# Altium schematic symbol library jlcpcb_2025_04_resistors_extended_2512.schlib: 2667 symbols (part 8 of 14) (continued)
## FRP2512J470 TS (continued)
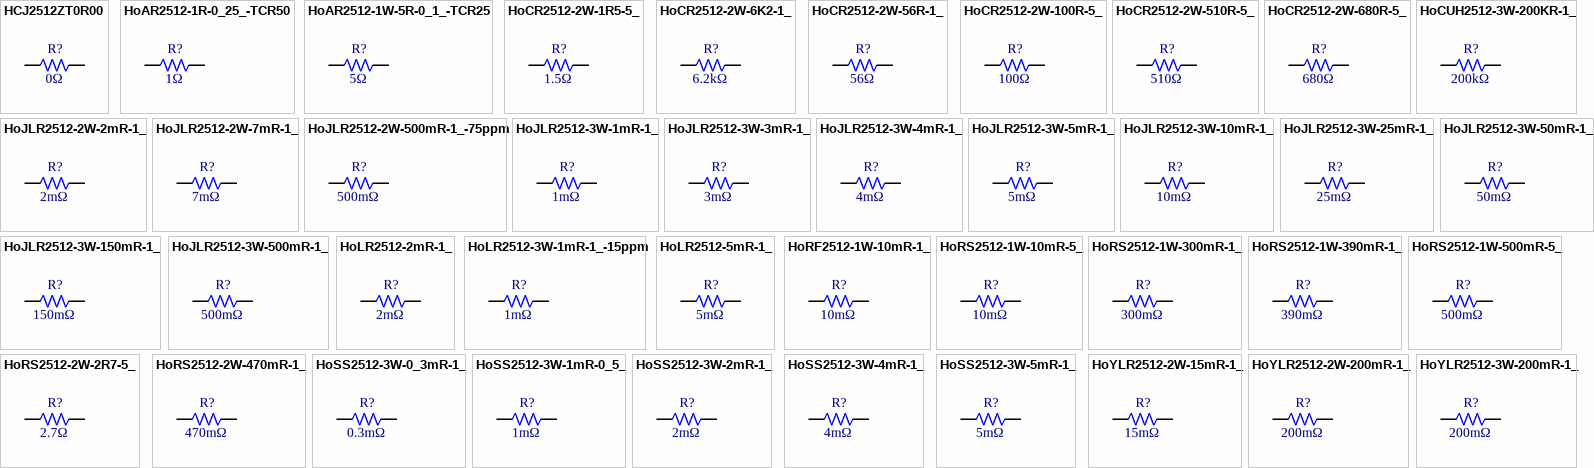
[diagram p37: symbols HCJ2512ZT0R00 to HoYLR2512-3W-200mR-1_]

## HCJ2512ZT0R00
designator R?  Resistance: 0Ω  (hidden comment: *)
Resistor, 0Ω, 2W, -55℃~+155℃, SMD 2512; Manufacturer: Uniroyal; Manufacturer Part Number: HCJ2512ZT0R00; Supplier 1: LCSC; Supplier Part Number 1: C346503; JLCPCB Part Number: C346503; Power Rating: 2W; Category: Resistors; Package Size: 2512; JLCPCB Basic Part: Yes; Temperature Rating: -55℃~+155℃; ComponentLink1Description: Datasheet; ComponentLink1URL: https://wmsc.lcsc.com/wmsc/upload/file/pdf/v2/lcsc/2304140030_SEI-Stackpole-Elec-HCJ2512ZT0R00_C346503.pdf; ComponentLink2Description: JLCPCB Part URL; ComponentLink2URL: https://jlcpcb.com/partdetail/C346503
pins: 1, 2
1 alternate drawing of the same symbol

## HoAR2512-1R-0_25_-TCR50
designator R?  Resistance: 1Ω  (hidden comment: *)
Resistor, 1Ω, ±0.25%, ±50ppm/℃, -55℃~+155℃, SMD 2512; Manufacturer: Uniroyal; Manufacturer Part Number: HoAR2512-1R-0.25%-TCR50; Supplier 1: LCSC; Supplier Part Number 1: C2912612; JLCPCB Part Number: C2912612; Category: Resistors; Package Size: 2512; JLCPCB Basic Part: Yes; Tolerance: ±0.25%; Temperature Coefficient: ±50ppm/℃; Temperature Rating: -55℃~+155℃; ComponentLink1Description: Datasheet; ComponentLink1URL: https://wmsc.lcsc.com/wmsc/upload/file/pdf/v2/lcsc/2111091630_Milliohm-HoAR2512-1R-0-25--TCR50_C2912612.pdf; ComponentLink2Description: JLCPCB Part URL; ComponentLink2URL: https://jlcpcb.com/partdetail/C2912612
pins: 1, 2
1 alternate drawing of the same symbol

## HoAR2512-1W-5R-0_1_-TCR25
designator R?  Resistance: 5Ω  (hidden comment: *)
Resistor, 5Ω, ±0.1%, 1W, ±25ppm/℃, SMD 2512; Manufacturer: Uniroyal; Manufacturer Part Number: HoAR2512-1W-5R-0.1%-TCR25; Supplier 1: LCSC; Supplier Part Number 1: C5123609; JLCPCB Part Number: C5123609; Power Rating: 1W; Category: Resistors; Package Size: 2512; JLCPCB Basic Part: Yes; Tolerance: ±0.1%; Temperature Coefficient: ±25ppm/℃; ComponentLink1Description: Datasheet; ComponentLink1URL: https://wmsc.lcsc.com/wmsc/upload/file/pdf/v2/lcsc/2208051800_Milliohm-HoAR2512-1W-5R-0-1--TCR25_C5123609.pdf; ComponentLink2Description: JLCPCB Part URL; ComponentLink2URL: https://jlcpcb.com/partdetail/C5123609
pins: 1, 2
1 alternate drawing of the same symbol

## HoCR2512-2W-1R5-5_
designator R?  Resistance: 1.5Ω  (hidden comment: *)
Resistor, 1.5Ω, ±5%, 2W, 250V, ±200ppm/℃, -55℃~+155℃, SMD 2512; Manufacturer: Uniroyal; Manufacturer Part Number: HoCR2512-2W-1R5-5%; Supplier 1: LCSC; Supplier Part Number 1: C2912627; JLCPCB Part Number: C2912627; Power Rating: 2W; Category: Resistors; Package Size: 2512; JLCPCB Basic Part: Yes; Tolerance: ±5%; Voltage Rating: 250V; Temperature Coefficient: ±200ppm/℃; Temperature Rating: -55℃~+155℃; ComponentLink1Description: Datasheet; ComponentLink1URL: https://wmsc.lcsc.com/wmsc/upload/file/pdf/v2/lcsc/2111251230_Milliohm-HoCR2512-2W-1R5-5-_C2912627.pdf; ComponentLink2Description: JLCPCB Part URL; ComponentLink2URL: https://jlcpcb.com/partdetail/C2912627
pins: 1, 2
1 alternate drawing of the same symbol

## HoCR2512-2W-6K2-1_
designator R?  Resistance: 6.2kΩ  (hidden comment: *)
Resistor, 6.2kΩ, ±1%, 2W, 250V, ±100ppm/℃, -55℃~+155℃, SMD 2512; Manufacturer: Uniroyal; Manufacturer Part Number: HoCR2512-2W-6K2-1%; Supplier 1: LCSC; Supplier Part Number 1: C2912631; JLCPCB Part Number: C2912631; Power Rating: 2W; Category: Resistors; Package Size: 2512; JLCPCB Basic Part: Yes; Tolerance: ±1%; Voltage Rating: 250V; Temperature Coefficient: ±100ppm/℃; Temperature Rating: -55℃~+155℃; ComponentLink1Description: Datasheet; ComponentLink1URL: https://wmsc.lcsc.com/wmsc/upload/file/pdf/v2/lcsc/2111251230_Milliohm-HoCR2512-2W-6K2-1-_C2912631.pdf; ComponentLink2Description: JLCPCB Part URL; ComponentLink2URL: https://jlcpcb.com/partdetail/C2912631
pins: 1, 2
1 alternate drawing of the same symbol

## HoCR2512-2W-56R-1_
designator R?  Resistance: 56Ω  (hidden comment: *)
Resistor, 56Ω, ±1%, 2W, 250V, ±100ppm/℃, -55℃~+155℃, SMD 2512; Manufacturer: Uniroyal; Manufacturer Part Number: HoCR2512-2W-56R-1%; Supplier 1: LCSC; Supplier Part Number 1: C2912630; JLCPCB Part Number: C2912630; Power Rating: 2W; Category: Resistors; Package Size: 2512; JLCPCB Basic Part: Yes; Tolerance: ±1%; Voltage Rating: 250V; Temperature Coefficient: ±100ppm/℃; Temperature Rating: -55℃~+155℃; ComponentLink1Description: Datasheet; ComponentLink1URL: https://wmsc.lcsc.com/wmsc/upload/file/pdf/v2/lcsc/2111251230_Milliohm-HoCR2512-2W-56R-1-_C2912630.pdf; ComponentLink2Description: JLCPCB Part URL; ComponentLink2URL: https://jlcpcb.com/partdetail/C2912630
pins: 1, 2
1 alternate drawing of the same symbol

## HoCR2512-2W-100R-5_
designator R?  Resistance: 100Ω  (hidden comment: *)
Resistor, 100Ω, ±5%, 2W, 250V, ±100ppm/℃, -55℃~+155℃, SMD 2512; Manufacturer: Uniroyal; Manufacturer Part Number: HoCR2512-2W-100R-5%; Supplier 1: LCSC; Supplier Part Number 1: C2904495; JLCPCB Part Number: C2904495; Power Rating: 2W; Category: Resistors; Package Size: 2512; JLCPCB Basic Part: Yes; Tolerance: ±5%; Voltage Rating: 250V; Temperature Coefficient: ±100ppm/℃; Temperature Rating: -55℃~+155℃; ComponentLink1Description: Datasheet; ComponentLink1URL: https://wmsc.lcsc.com/wmsc/upload/file/pdf/v2/lcsc/2111101730_Milliohm-HoCR2512-2W-100R-5-_C2904495.pdf; ComponentLink2Description: JLCPCB Part URL; ComponentLink2URL: https://jlcpcb.com/partdetail/C2904495
pins: 1, 2
1 alternate drawing of the same symbol

## HoCR2512-2W-510R-5_
designator R?  Resistance: 510Ω  (hidden comment: *)
Resistor, 510Ω, ±5%, 2W, 250V, ±100ppm/℃, -55℃~+155℃, SMD 2512; Manufacturer: Uniroyal; Manufacturer Part Number: HoCR2512-2W-510R-5%; Supplier 1: LCSC; Supplier Part Number 1: C2912629; JLCPCB Part Number: C2912629; Power Rating: 2W; Category: Resistors; Package Size: 2512; JLCPCB Basic Part: Yes; Tolerance: ±5%; Voltage Rating: 250V; Temperature Coefficient: ±100ppm/℃; Temperature Rating: -55℃~+155℃; ComponentLink1Description: Datasheet; ComponentLink1URL: https://wmsc.lcsc.com/wmsc/upload/file/pdf/v2/lcsc/2111251230_Milliohm-HoCR2512-2W-510R-5-_C2912629.pdf; ComponentLink2Description: JLCPCB Part URL; ComponentLink2URL: https://jlcpcb.com/partdetail/C2912629
pins: 1, 2
1 alternate drawing of the same symbol

## HoCR2512-2W-680R-5_
designator R?  Resistance: 680Ω  (hidden comment: *)
Resistor, 680Ω, ±5%, 2W, SMD 2512; Manufacturer: Uniroyal; Manufacturer Part Number: HoCR2512-2W-680R-5%; Supplier 1: LCSC; Supplier Part Number 1: C5123633; JLCPCB Part Number: C5123633; Power Rating: 2W; Category: Resistors; Package Size: 2512; JLCPCB Basic Part: Yes; Tolerance: ±5%; ComponentLink1Description: Datasheet; ComponentLink1URL: https://wmsc.lcsc.com/wmsc/upload/file/pdf/v2/lcsc/2208151830_Milliohm-HoCR2512-2W-680R-5-_C5123633.pdf; ComponentLink2Description: JLCPCB Part URL; ComponentLink2URL: https://jlcpcb.com/partdetail/C5123633
pins: 1, 2
1 alternate drawing of the same symbol

## HoCUH2512-3W-200KR-1_
designator R?  Resistance: 200kΩ  (hidden comment: *)
Resistor, 200kΩ, ±1%, 3W, SMD 2512; Manufacturer: Uniroyal; Manufacturer Part Number: HoCUH2512-3W-200KR-1%; Supplier 1: LCSC; Supplier Part Number 1: C5123645; JLCPCB Part Number: C5123645; Power Rating: 3W; Category: Resistors; Package Size: 2512; JLCPCB Basic Part: Yes; Tolerance: ±1%; ComponentLink1Description: Datasheet; ComponentLink1URL: https://wmsc.lcsc.com/wmsc/upload/file/pdf/v2/lcsc/2208171800_Milliohm-HoCUH2512-3W-200KR-1-_C5123645.pdf; ComponentLink2Description: JLCPCB Part URL; ComponentLink2URL: https://jlcpcb.com/partdetail/C5123645
pins: 1, 2
1 alternate drawing of the same symbol

## HoJLR2512-2W-2mR-1_
designator R?  Resistance: 2mΩ  (hidden comment: *)
Resistor, 2mΩ, 2W, SMD 2512; Manufacturer: Uniroyal; Manufacturer Part Number: HoJLR2512-2W-2mR-1%; Supplier 1: LCSC; Supplier Part Number 1: C2904228; JLCPCB Part Number: C2904228; Power Rating: 2W; Category: Resistors; Package Size: 2512; JLCPCB Basic Part: Yes; ComponentLink1Description: Datasheet; ComponentLink1URL: https://wmsc.lcsc.com/wmsc/upload/file/pdf/v2/lcsc/2110272030_Milliohm-HoJLR2512-2W-2mR-1-_C2904228.pdf; ComponentLink2Description: JLCPCB Part URL; ComponentLink2URL: https://jlcpcb.com/partdetail/C2904228
pins: 1, 2
1 alternate drawing of the same symbol

## HoJLR2512-2W-7mR-1_
designator R?  Resistance: 7mΩ  (hidden comment: *)
Resistor, 7mΩ, 2W, SMD 2512; Manufacturer: Uniroyal; Manufacturer Part Number: HoJLR2512-2W-7mR-1%; Supplier 1: LCSC; Supplier Part Number 1: C2904232; JLCPCB Part Number: C2904232; Power Rating: 2W; Category: Resistors; Package Size: 2512; JLCPCB Basic Part: Yes; ComponentLink1Description: Datasheet; ComponentLink2Description: JLCPCB Part URL; ComponentLink2URL: https://jlcpcb.com/partdetail/C2904232
pins: 1, 2
1 alternate drawing of the same symbol

## HoJLR2512-2W-500mR-1_-75ppm
designator R?  Resistance: 500mΩ  (hidden comment: *)
Resistor, 500mΩ, 2W, SMD 2512; Manufacturer: Uniroyal; Manufacturer Part Number: HoJLR2512-2W-500mR-1%-75ppm; Supplier 1: LCSC; Supplier Part Number 1: C2924583; JLCPCB Part Number: C2924583; Power Rating: 2W; Category: Resistors; Package Size: 2512; JLCPCB Basic Part: Yes; ComponentLink1Description: Datasheet; ComponentLink1URL: https://wmsc.lcsc.com/wmsc/upload/file/pdf/v2/lcsc/2201121300_Milliohm-HoJLR2512-2W-500mR-1--75ppm_C2924583.pdf; ComponentLink2Description: JLCPCB Part URL; ComponentLink2URL: https://jlcpcb.com/partdetail/C2924583
pins: 1, 2
1 alternate drawing of the same symbol

## HoJLR2512-3W-1mR-1_
designator R?  Resistance: 1mΩ  (hidden comment: *)
Resistor, 1mΩ, 3W, SMD 2512; Manufacturer: Uniroyal; Manufacturer Part Number: HoJLR2512-3W-1mR-1%; Supplier 1: LCSC; Supplier Part Number 1: C2903470; JLCPCB Part Number: C2903470; Power Rating: 3W; Category: Resistors; Package Size: 2512; JLCPCB Basic Part: Yes; ComponentLink1Description: Datasheet; ComponentLink1URL: https://wmsc.lcsc.com/wmsc/upload/file/pdf/v2/lcsc/2110101130_Milliohm-HoJLR2512-3W-1mR-1-_C2903470.pdf; ComponentLink2Description: JLCPCB Part URL; ComponentLink2URL: https://jlcpcb.com/partdetail/C2903470
pins: 1, 2
1 alternate drawing of the same symbol

## HoJLR2512-3W-3mR-1_
designator R?  Resistance: 3mΩ  (hidden comment: *)
Resistor, 3mΩ, 3W, SMD 2512; Manufacturer: Uniroyal; Manufacturer Part Number: HoJLR2512-3W-3mR-1%; Supplier 1: LCSC; Supplier Part Number 1: C2903488; JLCPCB Part Number: C2903488; Power Rating: 3W; Category: Resistors; Package Size: 2512; JLCPCB Basic Part: Yes; ComponentLink1Description: Datasheet; ComponentLink1URL: https://wmsc.lcsc.com/wmsc/upload/file/pdf/v2/lcsc/2110101130_Milliohm-HoJLR2512-3W-3mR-1-_C2903488.pdf; ComponentLink2Description: JLCPCB Part URL; ComponentLink2URL: https://jlcpcb.com/partdetail/C2903488
pins: 1, 2
1 alternate drawing of the same symbol

## HoJLR2512-3W-4mR-1_
designator R?  Resistance: 4mΩ  (hidden comment: *)
Resistor, 4mΩ, 3W, SMD 2512; Manufacturer: Uniroyal; Manufacturer Part Number: HoJLR2512-3W-4mR-1%; Supplier 1: LCSC; Supplier Part Number 1: C2904236; JLCPCB Part Number: C2904236; Power Rating: 3W; Category: Resistors; Package Size: 2512; JLCPCB Basic Part: Yes; ComponentLink1Description: Datasheet; ComponentLink1URL: https://wmsc.lcsc.com/wmsc/upload/file/pdf/v2/lcsc/2110272030_Milliohm-HoJLR2512-3W-4mR-1-_C2904236.pdf; ComponentLink2Description: JLCPCB Part URL; ComponentLink2URL: https://jlcpcb.com/partdetail/C2904236
pins: 1, 2
1 alternate drawing of the same symbol

## HoJLR2512-3W-5mR-1_
designator R?  Resistance: 5mΩ  (hidden comment: *)
Resistor, 5mΩ, 3W, SMD 2512; Manufacturer: Uniroyal; Manufacturer Part Number: HoJLR2512-3W-5mR-1%; Supplier 1: LCSC; Supplier Part Number 1: C2903482; JLCPCB Part Number: C2903482; Power Rating: 3W; Category: Resistors; Package Size: 2512; JLCPCB Basic Part: Yes; ComponentLink1Description: Datasheet; ComponentLink1URL: https://wmsc.lcsc.com/wmsc/upload/file/pdf/v2/lcsc/2110101130_Milliohm-HoJLR2512-3W-5mR-1-_C2903482.pdf; ComponentLink2Description: JLCPCB Part URL; ComponentLink2URL: https://jlcpcb.com/partdetail/C2903482
pins: 1, 2
1 alternate drawing of the same symbol

## HoJLR2512-3W-10mR-1_
designator R?  Resistance: 10mΩ  (hidden comment: *)
Resistor, 10mΩ, 3W, SMD 2512; Manufacturer: Uniroyal; Manufacturer Part Number: HoJLR2512-3W-10mR-1%; Supplier 1: LCSC; Supplier Part Number 1: C2903468; JLCPCB Part Number: C2903468; Power Rating: 3W; Category: Resistors; Package Size: 2512; JLCPCB Basic Part: Yes; ComponentLink1Description: Datasheet; ComponentLink1URL: https://wmsc.lcsc.com/wmsc/upload/file/pdf/v2/lcsc/2110101130_Milliohm-HoJLR2512-3W-10mR-1-_C2903468.pdf; ComponentLink2Description: JLCPCB Part URL; ComponentLink2URL: https://jlcpcb.com/partdetail/C2903468
pins: 1, 2
1 alternate drawing of the same symbol

## HoJLR2512-3W-25mR-1_
designator R?  Resistance: 25mΩ  (hidden comment: *)
Resistor, 25mΩ, 3W, SMD 2512; Manufacturer: Uniroyal; Manufacturer Part Number: HoJLR2512-3W-25mR-1%; Supplier 1: LCSC; Supplier Part Number 1: C2903480; JLCPCB Part Number: C2903480; Power Rating: 3W; Category: Resistors; Package Size: 2512; JLCPCB Basic Part: Yes; ComponentLink1Description: Datasheet; ComponentLink1URL: https://wmsc.lcsc.com/wmsc/upload/file/pdf/v2/lcsc/2110101130_Milliohm-HoJLR2512-3W-25mR-1-_C2903480.pdf; ComponentLink2Description: JLCPCB Part URL; ComponentLink2URL: https://jlcpcb.com/partdetail/C2903480
pins: 1, 2
1 alternate drawing of the same symbol

## HoJLR2512-3W-50mR-1_
designator R?  Resistance: 50mΩ  (hidden comment: *)
Resistor, 50mΩ, 3W, SMD 2512; Manufacturer: Uniroyal; Manufacturer Part Number: HoJLR2512-3W-50mR-1%; Supplier 1: LCSC; Supplier Part Number 1: C2903475; JLCPCB Part Number: C2903475; Power Rating: 3W; Category: Resistors; Package Size: 2512; JLCPCB Basic Part: Yes; ComponentLink1Description: Datasheet; ComponentLink1URL: https://wmsc.lcsc.com/wmsc/upload/file/pdf/v2/lcsc/2110101130_Milliohm-HoJLR2512-3W-50mR-1-_C2903475.pdf; ComponentLink2Description: JLCPCB Part URL; ComponentLink2URL: https://jlcpcb.com/partdetail/C2903475
pins: 1, 2
1 alternate drawing of the same symbol

## HoJLR2512-3W-150mR-1_
designator R?  Resistance: 150mΩ  (hidden comment: *)
Resistor, 150mΩ, 3W, SMD 2512; Manufacturer: Uniroyal; Manufacturer Part Number: HoJLR2512-3W-150mR-1%; Supplier 1: LCSC; Supplier Part Number 1: C2903485; JLCPCB Part Number: C2903485; Power Rating: 3W; Category: Resistors; Package Size: 2512; JLCPCB Basic Part: Yes; ComponentLink1Description: Datasheet; ComponentLink1URL: https://wmsc.lcsc.com/wmsc/upload/file/pdf/v2/lcsc/2110101130_Milliohm-HoJLR2512-3W-150mR-1-_C2903485.pdf; ComponentLink2Description: JLCPCB Part URL; ComponentLink2URL: https://jlcpcb.com/partdetail/C2903485
pins: 1, 2
1 alternate drawing of the same symbol

## HoJLR2512-3W-500mR-1_
designator R?  Resistance: 500mΩ  (hidden comment: *)
Resistor, 500mΩ, 3W, SMD 2512; Manufacturer: Uniroyal; Manufacturer Part Number: HoJLR2512-3W-500mR-1%; Supplier 1: LCSC; Supplier Part Number 1: C2904268; JLCPCB Part Number: C2904268; Power Rating: 3W; Category: Resistors; Package Size: 2512; JLCPCB Basic Part: Yes; ComponentLink1Description: Datasheet; ComponentLink1URL: https://wmsc.lcsc.com/wmsc/upload/file/pdf/v2/lcsc/2110272030_Milliohm-HoJLR2512-3W-500mR-1-_C2904268.pdf; ComponentLink2Description: JLCPCB Part URL; ComponentLink2URL: https://jlcpcb.com/partdetail/C2904268
pins: 1, 2
1 alternate drawing of the same symbol

## HoLR2512-2mR-1_
designator R?  Resistance: 2mΩ  (hidden comment: *)
Resistor, 2mΩ, SMD 2512; Manufacturer: Uniroyal; Manufacturer Part Number: HoLR2512-2mR-1%; Supplier 1: LCSC; Supplier Part Number 1: C2844506; JLCPCB Part Number: C2844506; Category: Resistors; Package Size: 2512; JLCPCB Basic Part: Yes; ComponentLink1Description: Datasheet; ComponentLink1URL: https://wmsc.lcsc.com/wmsc/upload/file/pdf/v2/lcsc/2108072230_Milliohm-HoLR2512-2mR-1-_C2844506.pdf; ComponentLink2Description: JLCPCB Part URL; ComponentLink2URL: https://jlcpcb.com/partdetail/C2844506
pins: 1, 2
1 alternate drawing of the same symbol

## HoLR2512-3W-1mR-1_-15ppm
designator R?  Resistance: 1mΩ  (hidden comment: *)
Resistor, 1mΩ, 3W, SMD 2512; Manufacturer: Uniroyal; Manufacturer Part Number: HoLR2512-3W-1mR-1%-15ppm; Supplier 1: LCSC; Supplier Part Number 1: C2908363; JLCPCB Part Number: C2908363; Power Rating: 3W; Category: Resistors; Package Size: 2512; JLCPCB Basic Part: Yes; ComponentLink1Description: Datasheet; ComponentLink1URL: https://wmsc.lcsc.com/wmsc/upload/file/pdf/v2/lcsc/2111241830_Milliohm-HoLR2512-3W-1mR-1--15ppm_C2908363.pdf; ComponentLink2Description: JLCPCB Part URL; ComponentLink2URL: https://jlcpcb.com/partdetail/C2908363
pins: 1, 2
1 alternate drawing of the same symbol

## HoLR2512-5mR-1_
designator R?  Resistance: 5mΩ  (hidden comment: *)
Resistor, 5mΩ, SMD 2512; Manufacturer: Uniroyal; Manufacturer Part Number: HoLR2512-5mR-1%; Supplier 1: LCSC; Supplier Part Number 1: C2844509; JLCPCB Part Number: C2844509; Category: Resistors; Package Size: 2512; JLCPCB Basic Part: Yes; ComponentLink1Description: Datasheet; ComponentLink1URL: https://wmsc.lcsc.com/wmsc/upload/file/pdf/v2/lcsc/2108072230_Milliohm-HoLR2512-5mR-1-_C2844509.pdf; ComponentLink2Description: JLCPCB Part URL; ComponentLink2URL: https://jlcpcb.com/partdetail/C2844509
pins: 1, 2
1 alternate drawing of the same symbol

## HoRF2512-1W-10mR-1_
designator R?  Resistance: 10mΩ  (hidden comment: *)
Resistor, 10mΩ, ±1%, 1W, SMD 2512; Manufacturer: Uniroyal; Manufacturer Part Number: HoRF2512-1W-10mR-1%; Supplier 1: LCSC; Supplier Part Number 1: C5127865; JLCPCB Part Number: C5127865; Power Rating: 1W; Category: Resistors; Package Size: 2512; JLCPCB Basic Part: Yes; Tolerance: ±1%; ComponentLink1Description: Datasheet; ComponentLink1URL: https://wmsc.lcsc.com/wmsc/upload/file/pdf/v2/lcsc/2208250030_Milliohm-HoRF2512-1W-10mR-1-_C5127865.pdf; ComponentLink2Description: JLCPCB Part URL; ComponentLink2URL: https://jlcpcb.com/partdetail/C5127865
pins: 1, 2
1 alternate drawing of the same symbol

## HoRS2512-1W-10mR-5_
designator R?  Resistance: 10mΩ  (hidden comment: *)
Resistor, 10mΩ, ±5%, 1W, ±1500ppm/℃, -55℃~+155℃, SMD 2512; Manufacturer: Uniroyal; Manufacturer Part Number: HoRS2512-1W-10mR-5%; Supplier 1: LCSC; Supplier Part Number 1: C2912758; JLCPCB Part Number: C2912758; Power Rating: 1W; Category: Resistors; Package Size: 2512; JLCPCB Basic Part: Yes; Tolerance: ±5%; Temperature Coefficient: ±1500ppm/℃; Temperature Rating: -55℃~+155℃; ComponentLink1Description: Datasheet; ComponentLink1URL: https://wmsc.lcsc.com/wmsc/upload/file/pdf/v2/lcsc/2111190930_Milliohm-HoRS2512-1W-10mR-5-_C2912758.pdf; ComponentLink2Description: JLCPCB Part URL; ComponentLink2URL: https://jlcpcb.com/partdetail/C2912758
pins: 1, 2
1 alternate drawing of the same symbol

## HoRS2512-1W-300mR-1_
designator R?  Resistance: 300mΩ  (hidden comment: *)
Resistor, 300mΩ, ±1%, 1W, ±500ppm/℃, -55℃~+155℃, SMD 2512; Manufacturer: Uniroyal; Manufacturer Part Number: HoRS2512-1W-300mR-1%; Supplier 1: LCSC; Supplier Part Number 1: C2904492; JLCPCB Part Number: C2904492; Power Rating: 1W; Category: Resistors; Package Size: 2512; JLCPCB Basic Part: Yes; Tolerance: ±1%; Temperature Coefficient: ±500ppm/℃; Temperature Rating: -55℃~+155℃; ComponentLink1Description: Datasheet; ComponentLink1URL: https://wmsc.lcsc.com/wmsc/upload/file/pdf/v2/lcsc/2111101730_Milliohm-HoRS2512-1W-300mR-1-_C2904492.pdf; ComponentLink2Description: JLCPCB Part URL; ComponentLink2URL: https://jlcpcb.com/partdetail/C2904492
pins: 1, 2
1 alternate drawing of the same symbol

## HoRS2512-1W-390mR-1_
designator R?  Resistance: 390mΩ  (hidden comment: *)
Resistor, 390mΩ, ±1%, 1W, ±500ppm/℃, -55℃~+155℃, SMD 2512; Manufacturer: Uniroyal; Manufacturer Part Number: HoRS2512-1W-390mR-1%; Supplier 1: LCSC; Supplier Part Number 1: C2912764; JLCPCB Part Number: C2912764; Power Rating: 1W; Category: Resistors; Package Size: 2512; JLCPCB Basic Part: Yes; Tolerance: ±1%; Temperature Coefficient: ±500ppm/℃; Temperature Rating: -55℃~+155℃; ComponentLink1Description: Datasheet; ComponentLink1URL: https://wmsc.lcsc.com/wmsc/upload/file/pdf/v2/lcsc/2111190930_Milliohm-HoRS2512-1W-390mR-1-_C2912764.pdf; ComponentLink2Description: JLCPCB Part URL; ComponentLink2URL: https://jlcpcb.com/partdetail/C2912764
pins: 1, 2
1 alternate drawing of the same symbol

## HoRS2512-1W-500mR-5_
designator R?  Resistance: 500mΩ  (hidden comment: *)
Resistor, 500mΩ, ±5%, 1W, ±500ppm/℃, -55℃~+155℃, SMD 2512; Manufacturer: Uniroyal; Manufacturer Part Number: HoRS2512-1W-500mR-5%; Supplier 1: LCSC; Supplier Part Number 1: C2912767; JLCPCB Part Number: C2912767; Power Rating: 1W; Category: Resistors; Package Size: 2512; JLCPCB Basic Part: Yes; Tolerance: ±5%; Temperature Coefficient: ±500ppm/℃; Temperature Rating: -55℃~+155℃; ComponentLink1Description: Datasheet; ComponentLink1URL: https://wmsc.lcsc.com/wmsc/upload/file/pdf/v2/lcsc/2111190930_Milliohm-HoRS2512-1W-500mR-5-_C2912767.pdf; ComponentLink2Description: JLCPCB Part URL; ComponentLink2URL: https://jlcpcb.com/partdetail/C2912767
pins: 1, 2
1 alternate drawing of the same symbol

## HoRS2512-2W-2R7-5_
designator R?  Resistance: 2.7Ω  (hidden comment: *)
Resistor, 2.7Ω, ±5%, 2W, -55℃~+155℃, SMD 2512; Manufacturer: Uniroyal; Manufacturer Part Number: HoRS2512-2W-2R7-5%; Supplier 1: LCSC; Supplier Part Number 1: C2912771; JLCPCB Part Number: C2912771; Power Rating: 2W; Category: Resistors; Package Size: 2512; JLCPCB Basic Part: Yes; Tolerance: ±5%; Temperature Rating: -55℃~+155℃; ComponentLink1Description: Datasheet; ComponentLink2Description: JLCPCB Part URL; ComponentLink2URL: https://jlcpcb.com/partdetail/C2912771
pins: 1, 2
1 alternate drawing of the same symbol

## HoRS2512-2W-470mR-1_
designator R?  Resistance: 470mΩ  (hidden comment: *)
Resistor, 470mΩ, ±1%, 2W, ±500ppm/℃, -55℃~+155℃, SMD 2512; Manufacturer: Uniroyal; Manufacturer Part Number: HoRS2512-2W-470mR-1%; Supplier 1: LCSC; Supplier Part Number 1: C2912772; JLCPCB Part Number: C2912772; Power Rating: 2W; Category: Resistors; Package Size: 2512; JLCPCB Basic Part: Yes; Tolerance: ±1%; Temperature Coefficient: ±500ppm/℃; Temperature Rating: -55℃~+155℃; ComponentLink1Description: Datasheet; ComponentLink1URL: https://wmsc.lcsc.com/wmsc/upload/file/pdf/v2/lcsc/2111191930_Milliohm-HoRS2512-2W-470mR-1-_C2912772.pdf; ComponentLink2Description: JLCPCB Part URL; ComponentLink2URL: https://jlcpcb.com/partdetail/C2912772
pins: 1, 2
1 alternate drawing of the same symbol

## HoSS2512-3W-0_3mR-1_
designator R?  Resistance: 0.3mΩ  (hidden comment: *)
Resistor, 0.3mΩ, ±1%, 3W, SMD 2512; Manufacturer: Uniroyal; Manufacturer Part Number: HoSS2512-3W-0.3mR-1%; Supplier 1: LCSC; Supplier Part Number 1: C5336180; JLCPCB Part Number: C5336180; Power Rating: 3W; Category: Resistors; Package Size: 2512; JLCPCB Basic Part: Yes; Tolerance: ±1%; ComponentLink1Description: Datasheet; ComponentLink1URL: https://wmsc.lcsc.com/wmsc/upload/file/pdf/v2/lcsc/2212291709_Milliohm-HoSS2512-3W-0-3mR-1-_C5336180.pdf; ComponentLink2Description: JLCPCB Part URL; ComponentLink2URL: https://jlcpcb.com/partdetail/C5336180
pins: 1, 2
1 alternate drawing of the same symbol

## HoSS2512-3W-1mR-0_5_
designator R?  Resistance: 1mΩ  (hidden comment: *)
Resistor, 1mΩ, 3W, SMD 2512; Manufacturer: Uniroyal; Manufacturer Part Number: HoSS2512-3W-1mR-0.5%; Supplier 1: LCSC; Supplier Part Number 1: C5336183; JLCPCB Part Number: C5336183; Power Rating: 3W; Category: Resistors; Package Size: 2512; JLCPCB Basic Part: Yes; ComponentLink1Description: Datasheet; ComponentLink1URL: https://wmsc.lcsc.com/wmsc/upload/file/pdf/v2/lcsc/2212291709_Milliohm-HoSS2512-3W-1mR-0-5-_C5336183.pdf; ComponentLink2Description: JLCPCB Part URL; ComponentLink2URL: https://jlcpcb.com/partdetail/C5336183
pins: 1, 2
1 alternate drawing of the same symbol

## HoSS2512-3W-2mR-1_
designator R?  Resistance: 2mΩ  (hidden comment: *)
Resistor, 2mΩ, ±1%, 3W, SMD 2512; Manufacturer: Uniroyal; Manufacturer Part Number: HoSS2512-3W-2mR-1%; Supplier 1: LCSC; Supplier Part Number 1: C5336185; JLCPCB Part Number: C5336185; Power Rating: 3W; Category: Resistors; Package Size: 2512; JLCPCB Basic Part: Yes; Tolerance: ±1%; ComponentLink1Description: Datasheet; ComponentLink1URL: https://wmsc.lcsc.com/wmsc/upload/file/pdf/v2/lcsc/2212291709_Milliohm-HoSS2512-3W-2mR-1-_C5336185.pdf; ComponentLink2Description: JLCPCB Part URL; ComponentLink2URL: https://jlcpcb.com/partdetail/C5336185
pins: 1, 2
1 alternate drawing of the same symbol

## HoSS2512-3W-4mR-1_
designator R?  Resistance: 4mΩ  (hidden comment: *)
Resistor, 4mΩ, ±1%, 3W, SMD 2512; Manufacturer: Uniroyal; Manufacturer Part Number: HoSS2512-3W-4mR-1%; Supplier 1: LCSC; Supplier Part Number 1: C5336187; JLCPCB Part Number: C5336187; Power Rating: 3W; Category: Resistors; Package Size: 2512; JLCPCB Basic Part: Yes; Tolerance: ±1%; ComponentLink1Description: Datasheet; ComponentLink1URL: https://wmsc.lcsc.com/wmsc/upload/file/pdf/v2/lcsc/2212291709_Milliohm-HoSS2512-3W-4mR-1-_C5336187.pdf; ComponentLink2Description: JLCPCB Part URL; ComponentLink2URL: https://jlcpcb.com/partdetail/C5336187
pins: 1, 2
1 alternate drawing of the same symbol

## HoSS2512-3W-5mR-1_
designator R?  Resistance: 5mΩ  (hidden comment: *)
Resistor, 5mΩ, ±1%, 3W, SMD 2512; Manufacturer: Uniroyal; Manufacturer Part Number: HoSS2512-3W-5mR-1%; Supplier 1: LCSC; Supplier Part Number 1: C5336188; JLCPCB Part Number: C5336188; Power Rating: 3W; Category: Resistors; Package Size: 2512; JLCPCB Basic Part: Yes; Tolerance: ±1%; ComponentLink1Description: Datasheet; ComponentLink1URL: https://wmsc.lcsc.com/wmsc/upload/file/pdf/v2/lcsc/2212291709_Milliohm-HoSS2512-3W-5mR-1-_C5336188.pdf; ComponentLink2Description: JLCPCB Part URL; ComponentLink2URL: https://jlcpcb.com/partdetail/C5336188
pins: 1, 2
1 alternate drawing of the same symbol

## HoYLR2512-2W-15mR-1_
designator R?  Resistance: 15mΩ  (hidden comment: *)
Resistor, 15mΩ, ±1%, 2W, SMD 2512; Manufacturer: Uniroyal; Manufacturer Part Number: HoYLR2512-2W-15mR-1%; Supplier 1: LCSC; Supplier Part Number 1: C5375422; JLCPCB Part Number: C5375422; Power Rating: 2W; Category: Resistors; Package Size: 2512; JLCPCB Basic Part: Yes; Tolerance: ±1%; ComponentLink1Description: Datasheet; ComponentLink2Description: JLCPCB Part URL; ComponentLink2URL: https://jlcpcb.com/partdetail/C5375422
pins: 1, 2
1 alternate drawing of the same symbol

## HoYLR2512-2W-200mR-1_
designator R?  Resistance: 200mΩ  (hidden comment: *)
Resistor, 200mΩ, ±1%, 2W, SMD 2512; Manufacturer: Uniroyal; Manufacturer Part Number: HoYLR2512-2W-200mR-1%; Supplier 1: LCSC; Supplier Part Number 1: C5375444; JLCPCB Part Number: C5375444; Power Rating: 2W; Category: Resistors; Package Size: 2512; JLCPCB Basic Part: Yes; Tolerance: ±1%; ComponentLink1Description: Datasheet; ComponentLink2Description: JLCPCB Part URL; ComponentLink2URL: https://jlcpcb.com/partdetail/C5375444
pins: 1, 2
1 alternate drawing of the same symbol

## HoYLR2512-3W-200mR-1_
designator R?  Resistance: 200mΩ  (hidden comment: *)
Resistor, 200mΩ, ±1%, 3W, SMD 2512; Manufacturer: Uniroyal; Manufacturer Part Number: HoYLR2512-3W-200mR-1%; Supplier 1: LCSC; Supplier Part Number 1: C5375488; JLCPCB Part Number: C5375488; Power Rating: 3W; Category: Resistors; Package Size: 2512; JLCPCB Basic Part: Yes; Tolerance: ±1%; ComponentLink1Description: Datasheet; ComponentLink2Description: JLCPCB Part URL; ComponentLink2URL: https://jlcpcb.com/partdetail/C5375488
pins: 1, 2
1 alternate drawing of the same symbol

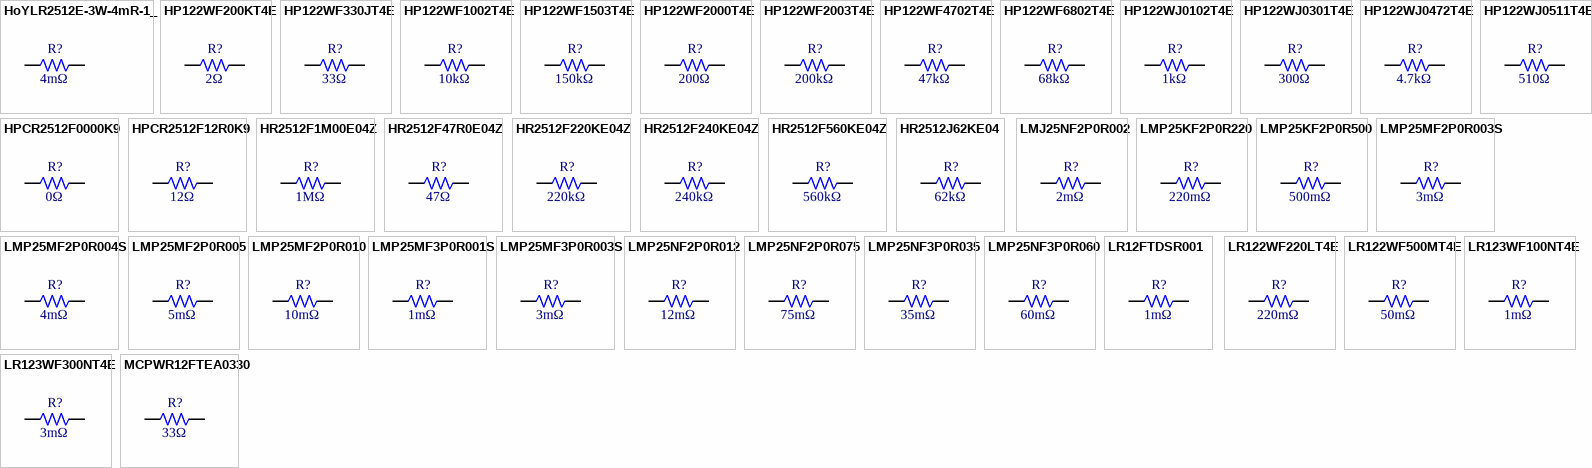
[diagram p38: symbols HoYLR2512E-3W-4mR-1_ to MCPWR12FTEA0330]

## HoYLR2512E-3W-4mR-1_
designator R?  Resistance: 4mΩ  (hidden comment: *)
Resistor, 4mΩ, ±1%, 3W, SMD 2512; Manufacturer: Uniroyal; Manufacturer Part Number: HoYLR2512E-3W-4mR-1%; Supplier 1: LCSC; Supplier Part Number 1: C5375455; JLCPCB Part Number: C5375455; Power Rating: 3W; Category: Resistors; Package Size: 2512; JLCPCB Basic Part: Yes; Tolerance: ±1%; ComponentLink1Description: Datasheet; ComponentLink1URL: https://wmsc.lcsc.com/wmsc/upload/file/pdf/v2/lcsc/2306061457_Milliohm-HoYLR2512E-3W-4mR-1-_C5375455.pdf; ComponentLink2Description: JLCPCB Part URL; ComponentLink2URL: https://jlcpcb.com/partdetail/C5375455
pins: 1, 2
1 alternate drawing of the same symbol

## HP122WF200KT4E
designator R?  Resistance: 2Ω  (hidden comment: *)
Resistor, 2Ω, ±1%, 2W, 200V, ±75ppm/℃, -55℃~+155℃, SMD 2512; Manufacturer: Uniroyal; Manufacturer Part Number: HP122WF200KT4E; Supplier 1: LCSC; Supplier Part Number 1: C91926; JLCPCB Part Number: C91926; Power Rating: 2W; Category: Resistors; Package Size: 2512; JLCPCB Basic Part: Yes; Tolerance: ±1%; Voltage Rating: 200V; Temperature Coefficient: ±75ppm/℃; Temperature Rating: -55℃~+155℃; ComponentLink1Description: Datasheet; ComponentLink1URL: https://wmsc.lcsc.com/wmsc/upload/file/pdf/v2/lcsc/1810301110_UNI-ROYAL-Uniroyal-Elec-HP122WF200KT4E_C91926.pdf; ComponentLink2Description: JLCPCB Part URL; ComponentLink2URL: https://jlcpcb.com/partdetail/C91926
pins: 1, 2
1 alternate drawing of the same symbol

## HP122WF330JT4E
designator R?  Resistance: 33Ω  (hidden comment: *)
Resistor, 33Ω, ±1%, 2W, 300V, -55℃~+155℃, SMD 2512; Manufacturer: Uniroyal; Manufacturer Part Number: HP122WF330JT4E; Supplier 1: LCSC; Supplier Part Number 1: C2758887; JLCPCB Part Number: C2758887; Power Rating: 2W; Category: Resistors; Package Size: 2512; JLCPCB Basic Part: Yes; Tolerance: ±1%; Voltage Rating: 300V; Temperature Rating: -55℃~+155℃; ComponentLink1Description: Datasheet; ComponentLink2Description: JLCPCB Part URL; ComponentLink2URL: https://jlcpcb.com/partdetail/C2758887
pins: 1, 2
1 alternate drawing of the same symbol

## HP122WF1002T4E
designator R?  Resistance: 10kΩ  (hidden comment: *)
Resistor, 10kΩ, ±1%, 2W, 300V, ±75ppm/℃, -55℃~+155℃, SMD 2512; Manufacturer: Uniroyal; Manufacturer Part Number: HP122WF1002T4E; Supplier 1: LCSC; Supplier Part Number 1: C2765765; JLCPCB Part Number: C2765765; Power Rating: 2W; Category: Resistors; Package Size: 2512; JLCPCB Basic Part: Yes; Tolerance: ±1%; Voltage Rating: 300V; Temperature Coefficient: ±75ppm/℃; Temperature Rating: -55℃~+155℃; ComponentLink1Description: Datasheet; ComponentLink1URL: https://wmsc.lcsc.com/wmsc/upload/file/pdf/v2/lcsc/2304140030_UNI-ROYAL-Uniroyal-Elec-HP122WF1002T4E_C2765765.pdf; ComponentLink2Description: JLCPCB Part URL; ComponentLink2URL: https://jlcpcb.com/partdetail/C2765765
pins: 1, 2
1 alternate drawing of the same symbol

## HP122WF1503T4E
designator R?  Resistance: 150kΩ  (hidden comment: *)
Resistor, 150kΩ, ±1%, 2W, 300V, -55℃~+155℃, SMD 2512; Manufacturer: Uniroyal; Manufacturer Part Number: HP122WF1503T4E; Supplier 1: LCSC; Supplier Part Number 1: C2758922; JLCPCB Part Number: C2758922; Power Rating: 2W; Category: Resistors; Package Size: 2512; JLCPCB Basic Part: Yes; Tolerance: ±1%; Voltage Rating: 300V; Temperature Rating: -55℃~+155℃; ComponentLink1Description: Datasheet; ComponentLink2Description: JLCPCB Part URL; ComponentLink2URL: https://jlcpcb.com/partdetail/C2758922
pins: 1, 2
1 alternate drawing of the same symbol

## HP122WF2000T4E
designator R?  Resistance: 200Ω  (hidden comment: *)
Resistor, 200Ω, ±1%, 2W, 300V, ±75ppm/℃, -55℃~+155℃, SMD 2512; Manufacturer: Uniroyal; Manufacturer Part Number: HP122WF2000T4E; Supplier 1: LCSC; Supplier Part Number 1: C2765767; JLCPCB Part Number: C2765767; Power Rating: 2W; Category: Resistors; Package Size: 2512; JLCPCB Basic Part: Yes; Tolerance: ±1%; Voltage Rating: 300V; Temperature Coefficient: ±75ppm/℃; Temperature Rating: -55℃~+155℃; ComponentLink1Description: Datasheet; ComponentLink1URL: https://wmsc.lcsc.com/wmsc/upload/file/pdf/v2/lcsc/2304140030_UNI-ROYAL-Uniroyal-Elec-HP122WF2000T4E_C2765767.pdf; ComponentLink2Description: JLCPCB Part URL; ComponentLink2URL: https://jlcpcb.com/partdetail/C2765767
pins: 1, 2
1 alternate drawing of the same symbol

## HP122WF2003T4E
designator R?  Resistance: 200kΩ  (hidden comment: *)
Resistor, 200kΩ, ±1%, 2W, 300V, -55℃~+155℃, SMD 2512; Manufacturer: Uniroyal; Manufacturer Part Number: HP122WF2003T4E; Supplier 1: LCSC; Supplier Part Number 1: C414884; JLCPCB Part Number: C414884; Power Rating: 2W; Category: Resistors; Package Size: 2512; JLCPCB Basic Part: Yes; Tolerance: ±1%; Voltage Rating: 300V; Temperature Rating: -55℃~+155℃; ComponentLink1Description: Datasheet; ComponentLink2Description: JLCPCB Part URL; ComponentLink2URL: https://jlcpcb.com/partdetail/C414884
pins: 1, 2
1 alternate drawing of the same symbol

## HP122WF4702T4E
designator R?  Resistance: 47kΩ  (hidden comment: *)
Resistor, 47kΩ, ±1%, 2W, 300V, ±75ppm/℃, -55℃~+155℃, SMD 2512; Manufacturer: Uniroyal; Manufacturer Part Number: HP122WF4702T4E; Supplier 1: LCSC; Supplier Part Number 1: C2775964; JLCPCB Part Number: C2775964; Power Rating: 2W; Category: Resistors; Package Size: 2512; JLCPCB Basic Part: Yes; Tolerance: ±1%; Voltage Rating: 300V; Temperature Coefficient: ±75ppm/℃; Temperature Rating: -55℃~+155℃; ComponentLink1Description: Datasheet; ComponentLink1URL: https://wmsc.lcsc.com/wmsc/upload/file/pdf/v2/lcsc/2304140030_UNI-ROYAL-Uniroyal-Elec-HP122WF4702T4E_C2775964.pdf; ComponentLink2Description: JLCPCB Part URL; ComponentLink2URL: https://jlcpcb.com/partdetail/C2775964
pins: 1, 2
1 alternate drawing of the same symbol

## HP122WF6802T4E
designator R?  Resistance: 68kΩ  (hidden comment: *)
Resistor, 68kΩ, ±1%, 2W, 300V, ±75ppm/℃, -55℃~+155℃, SMD 2512; Manufacturer: Uniroyal; Manufacturer Part Number: HP122WF6802T4E; Supplier 1: LCSC; Supplier Part Number 1: C2775995; JLCPCB Part Number: C2775995; Power Rating: 2W; Category: Resistors; Package Size: 2512; JLCPCB Basic Part: Yes; Tolerance: ±1%; Voltage Rating: 300V; Temperature Coefficient: ±75ppm/℃; Temperature Rating: -55℃~+155℃; ComponentLink1Description: Datasheet; ComponentLink1URL: https://wmsc.lcsc.com/wmsc/upload/file/pdf/v2/lcsc/2304140030_UNI-ROYAL-Uniroyal-Elec-HP122WF6802T4E_C2775995.pdf; ComponentLink2Description: JLCPCB Part URL; ComponentLink2URL: https://jlcpcb.com/partdetail/C2775995
pins: 1, 2
1 alternate drawing of the same symbol

## HP122WJ0102T4E
designator R?  Resistance: 1kΩ  (hidden comment: *)
Resistor, 1kΩ, ±5%, 2W, 200V, ±75ppm/℃, -55℃~+155℃, SMD 2512; Manufacturer: Uniroyal; Manufacturer Part Number: HP122WJ0102T4E; Supplier 1: LCSC; Supplier Part Number 1: C270948; JLCPCB Part Number: C270948; Power Rating: 2W; Category: Resistors; Package Size: 2512; JLCPCB Basic Part: Yes; Tolerance: ±5%; Voltage Rating: 200V; Temperature Coefficient: ±75ppm/℃; Temperature Rating: -55℃~+155℃; ComponentLink1Description: Datasheet; ComponentLink2Description: JLCPCB Part URL; ComponentLink2URL: https://jlcpcb.com/partdetail/C270948
pins: 1, 2
1 alternate drawing of the same symbol

## HP122WJ0301T4E
designator R?  Resistance: 300Ω  (hidden comment: *)
Resistor, 300Ω, ±5%, 2W, 200V, ±75ppm/℃, -55℃~+155℃, SMD 2512; Manufacturer: Uniroyal; Manufacturer Part Number: HP122WJ0301T4E; Supplier 1: LCSC; Supplier Part Number 1: C91264; JLCPCB Part Number: C91264; Power Rating: 2W; Category: Resistors; Package Size: 2512; JLCPCB Basic Part: Yes; Tolerance: ±5%; Voltage Rating: 200V; Temperature Coefficient: ±75ppm/℃; Temperature Rating: -55℃~+155℃; ComponentLink1Description: Datasheet; ComponentLink1URL: https://wmsc.lcsc.com/wmsc/upload/file/pdf/v2/lcsc/1810301125_UNI-ROYAL-Uniroyal-Elec-HP122WJ0301T4E_C91264.pdf; ComponentLink2Description: JLCPCB Part URL; ComponentLink2URL: https://jlcpcb.com/partdetail/C91264
pins: 1, 2
1 alternate drawing of the same symbol

## HP122WJ0472T4E
designator R?  Resistance: 4.7kΩ  (hidden comment: *)
Resistor, 4.7kΩ, ±5%, 2W, 300V, ±75ppm/℃, -55℃~+155℃, SMD 2512; Manufacturer: Uniroyal; Manufacturer Part Number: HP122WJ0472T4E; Supplier 1: LCSC; Supplier Part Number 1: C2791283; JLCPCB Part Number: C2791283; Power Rating: 2W; Category: Resistors; Package Size: 2512; JLCPCB Basic Part: Yes; Tolerance: ±5%; Voltage Rating: 300V; Temperature Coefficient: ±75ppm/℃; Temperature Rating: -55℃~+155℃; ComponentLink1Description: Datasheet; ComponentLink1URL: https://wmsc.lcsc.com/wmsc/upload/file/pdf/v2/lcsc/2304140030_UNI-ROYAL-Uniroyal-Elec-HP122WJ0472T4E_C2791283.pdf; ComponentLink2Description: JLCPCB Part URL; ComponentLink2URL: https://jlcpcb.com/partdetail/C2791283
pins: 1, 2
1 alternate drawing of the same symbol

## HP122WJ0511T4E
designator R?  Resistance: 510Ω  (hidden comment: *)
Resistor, 510Ω, ±5%, 2W, ±75ppm/℃, SMD 2512; Manufacturer: Uniroyal; Manufacturer Part Number: HP122WJ0511T4E; Supplier 1: LCSC; Supplier Part Number 1: C778413; JLCPCB Part Number: C778413; Power Rating: 2W; Category: Resistors; Package Size: 2512; JLCPCB Basic Part: Yes; Tolerance: ±5%; Temperature Coefficient: ±75ppm/℃; ComponentLink1Description: Datasheet; ComponentLink1URL: https://wmsc.lcsc.com/wmsc/upload/file/pdf/v2/lcsc/2304140030_UNI-ROYAL-Uniroyal-Elec-HP122WJ0511T4E_C778413.pdf; ComponentLink2Description: JLCPCB Part URL; ComponentLink2URL: https://jlcpcb.com/partdetail/C778413
pins: 1, 2
1 alternate drawing of the same symbol
